# Altium footprint library Connectors.PcbLib: 122 footprints (part 6 of 8)
Each footprint in its own frame and in the unit in brackets; x right, y up, seen from the top. Pads: shape width x height; smd on the part's side, far side on the other; paste and mask are expansions set on the pad; w line width, h text height; cw(c..) or ccw(c..) is an arc to the next point about the centre after c.
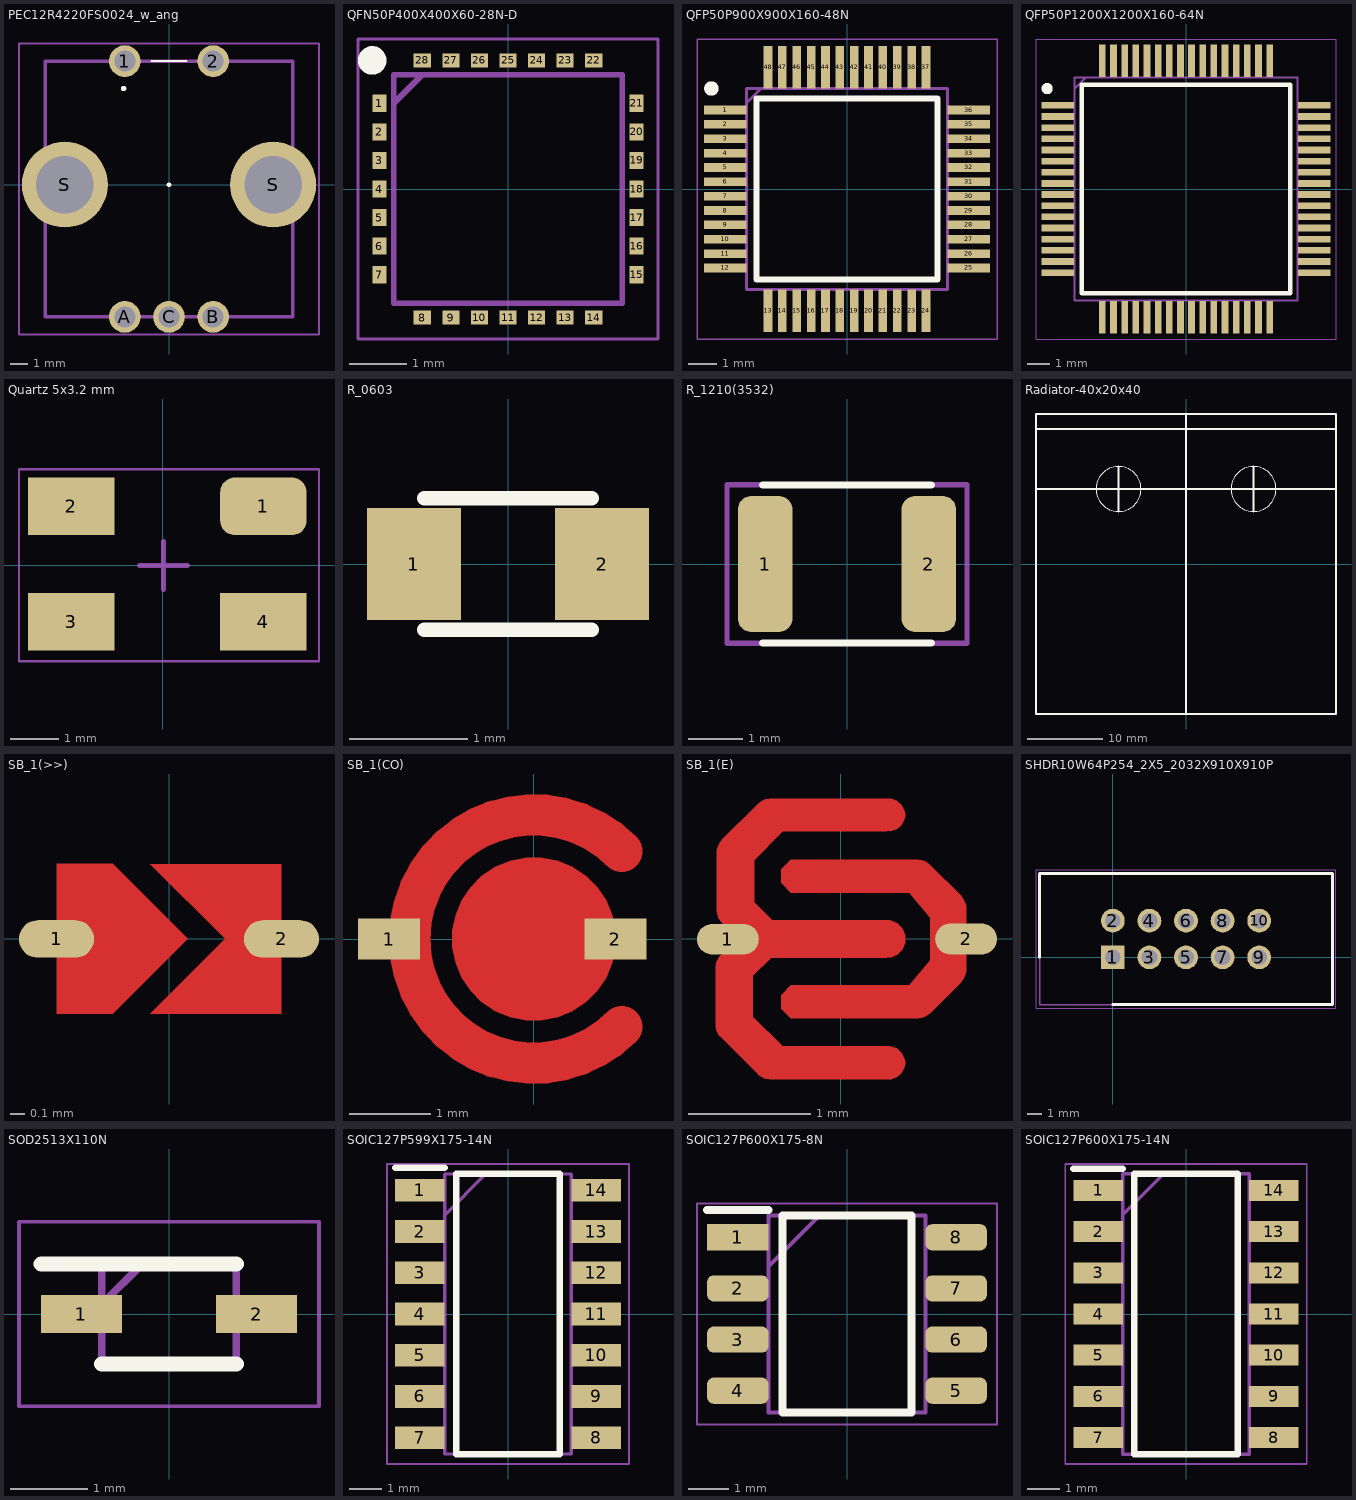
[diagram p5: the footprints below, top view; thin cyan lines are the x and y axes]

## PEC12R4220FS0024_w_ang [mm]
pads (7):
  round 1.8 hole 1.2: 1(-2.5,7) 2(2.5,7) A(-2.5,-7.5) B(2.5,-7.5) C(0,-7.5)
  round 4.875 hole 3.25: S(-5.9,0) S(5.9,0)
Top Overlay:
  lines w0.1: -1,7 1,7
  lines w0.2: -2.618,5.443 ccw(c-2.568,5.443) -2.518,5.443 ccw(c-2.568,5.443) -2.618,5.443
  lines w0.254: -0.01,0 0.01,0
Mechanical 13:
  lines w0.2: -7,-7.5 7,-7.5 7,7 -7,7 -7,-7.5
Mechanical 15:
  lines w0.1: -8.5,-8.5 8.5,-8.5 8.5,8 -8.5,8 -8.5,-8.5
3D body "PEC11R-4115F-S0018_w_ang.STEP": height 24.67, standoff -3.7, extent -10.054,-10.054 10.054,10.054

## QFN50P400X400X60-28N-D [mm]
pads (28):
  rect 0.25x0.3 smd: 1(-2.25,1.5) 2(-2.25,1) 3(-2.25,0.5) 4(-2.25,0) 5(-2.25,-0.5) 6(-2.25,-1) 7(-2.25,-1.5) 15(2.25,-1.5) 16(2.25,-1) 17(2.25,-0.5) 18(2.25,0) 19(2.25,0.5) 20(2.25,1) 21(2.25,1.5)
  rect 0.3x0.25 smd: 8(-1.5,-2.25) 9(-1,-2.25) 10(-0.5,-2.25) 11(0,-2.25) 12(0.5,-2.25) 13(1,-2.25) 14(1.5,-2.25) 22(1.5,2.25) 23(1,2.25) 24(0.5,2.25) 25(0,2.25) 26(-0.5,2.25) 27(-1,2.25) 28(-1.5,2.25)
Top Overlay:
  circle w0.25: c-2.375,2.25 r0.125
Mechanical 13:
  lines w0.1: -2,1.5 -1.5,2 ; -2,-2 2,-2 2,2 -2,2 -2,-2
Mechanical 15:
  lines w0.05: -2.625,-2.625 2.625,-2.625 2.625,2.625 -2.625,2.625 -2.625,-2.625
3D body "STM32L031G4U6.stp": height 0.6, standoff 0, extent -2.05,-2.05 2.05,2.05

## QFP50P900X900X160-48N [mm]
pads (48):
  rect 1.475x0.3 smd: 1(-4.238,2.75) 2(-4.238,2.25) 3(-4.238,1.75) 4(-4.238,1.25) 5(-4.238,0.75) 6(-4.238,0.25) 7(-4.238,-0.25) 8(-4.238,-0.75) 9(-4.238,-1.25) 10(-4.238,-1.75) 11(-4.238,-2.25) 12(-4.238,-2.75) 25(4.238,-2.75) 26(4.238,-2.25) 27(4.238,-1.75) 28(4.238,-1.25) 29(4.238,-0.75) 30(4.238,-0.25) 31(4.238,0.25) 32(4.238,0.75) 33(4.238,1.25) 34(4.238,1.75) 35(4.238,2.25) 36(4.238,2.75)
  rect 0.3x1.475 smd: 13(-2.75,-4.238) 14(-2.25,-4.238) 15(-1.75,-4.238) 16(-1.25,-4.238) 17(-0.75,-4.238) 18(-0.25,-4.238) 19(0.25,-4.238) 20(0.75,-4.238) 21(1.25,-4.238) 22(1.75,-4.238) 23(2.25,-4.238) 24(2.75,-4.238) 37(2.75,4.238) 38(2.25,4.238) 39(1.75,4.238) 40(1.25,4.238) 41(0.75,4.238) 42(0.25,4.238) 43(-0.25,4.238) 44(-0.75,4.238) 45(-1.25,4.238) 46(-1.75,4.238) 47(-2.25,4.238) 48(-2.75,4.238)
Top Overlay:
  circle w0.25: c-4.725,3.5 r0.125
  lines w0.2: -3.15,-3.15 -3.15,3.15 3.15,3.15 3.15,-3.15 -3.15,-3.15
Mechanical 13:
  lines w0.1: -3.5,3 -3,3.5 ; -3.5,-3.5 -3.5,3.5 3.5,3.5 3.5,-3.5 -3.5,-3.5
Mechanical 15:
  lines w0.05: -5.225,-5.225 -5.225,5.225 5.225,5.225 5.225,-5.225 -5.225,-5.225
3D body "STM32F103C8T6TR.stp": height 1.6, standoff 0, extent -4.5,-4.5 4.5,4.5

## QFP50P1200X1200X160-64N [mm]
pads (64):
  rect 1.45x0.3 smd: 1(-5.75,3.75) 2(-5.75,3.25) 3(-5.75,2.75) 4(-5.75,2.25) 5(-5.75,1.75) 6(-5.75,1.25) 7(-5.75,0.75) 8(-5.75,0.25) 9(-5.75,-0.25) 10(-5.75,-0.75) 11(-5.75,-1.25) 12(-5.75,-1.75) 13(-5.75,-2.25) 14(-5.75,-2.75) 15(-5.75,-3.25) 16(-5.75,-3.75) 33(5.75,-3.75) 34(5.75,-3.25) 35(5.75,-2.75) 36(5.75,-2.25) 37(5.75,-1.75) 38(5.75,-1.25) 39(5.75,-0.75) 40(5.75,-0.25) 41(5.75,0.25) 42(5.75,0.75) 43(5.75,1.25) 44(5.75,1.75) 45(5.75,2.25) 46(5.75,2.75) 47(5.75,3.25) 48(5.75,3.75)
  rect 0.3x1.45 smd: 17(-3.75,-5.75) 18(-3.25,-5.75) 19(-2.75,-5.75) 20(-2.25,-5.75) 21(-1.75,-5.75) 22(-1.25,-5.75) 23(-0.75,-5.75) 24(-0.25,-5.75) 25(0.25,-5.75) 26(0.75,-5.75) 27(1.25,-5.75) 28(1.75,-5.75) 29(2.25,-5.75) 30(2.75,-5.75) 31(3.25,-5.75) 32(3.75,-5.75) 49(3.75,5.75) 50(3.25,5.75) 51(2.75,5.75) 52(2.25,5.75) 53(1.75,5.75) 54(1.25,5.75) 55(0.75,5.75) 56(0.25,5.75) 57(-0.25,5.75) 58(-0.75,5.75) 59(-1.25,5.75) 60(-1.75,5.75) 61(-2.25,5.75) 62(-2.75,5.75) 63(-3.25,5.75) 64(-3.75,5.75)
Top Overlay:
  circle w0.25: c-6.225,4.5 r0.125
  lines w0.2: -4.675,-4.675 4.675,-4.675 4.675,4.675 -4.675,4.675 -4.675,-4.675
Mechanical 13:
  lines w0.1: -5,4.5 -4.5,5 ; -5,-5 5,-5 5,5 -5,5 -5,-5
Mechanical 15:
  lines w0.05: -6.725,-6.725 6.725,-6.725 6.725,6.725 -6.725,6.725 -6.725,-6.725
3D body "STM32F105R8T6.stp": height 1.6, standoff 0, extent -6,-6 6,6

## Quartz 5x3.2 mm [mm]
pads (4):
  rrect50% 1.8x1.2 smd: 1(2.092,1.229)
  rect 1.8x1.2 smd: 2(-1.908,1.229) 3(-1.908,-1.171) 4(2.092,-1.171)
Mechanical 8:
  lines w0.1: -0.492,0 0.008,0 ; 0.008,-0.5 0.008,0 ; 0.008,0.5 0.008,0 ; 0.508,0 0.008,0
Mechanical 15:
  lines w0.05: -3,-2 3.25,-2 3.25,2 -3,2 -3,-2
3D body "ABM3B.STEP": height 1.1, standoff -0.01, extent -2.5,-1.587 2.5,1.588

## R_0603 [mm] "Chip Resistor, EIA 0201, Metric 0603, Body 0.6 x 0.3mm, IPC Medium Density"
height 0.28
pads (2):
  rect 0.8x0.95 smd: 1(-0.8,0) 2(0.8,0)
Top Overlay:
  lines w0.127: -0.711,-0.559 0.711,-0.559 ; -0.711,0.559 0.711,0.559
3D body "RESC1608X64N.stp": height 0.64, standoff 0, extent -0.875,-0.475 0.875,0.475

## R_1210(3532) [mm]
pads (2):
  rrect50% 1x2.5 smd: 1(-1.5,0) 2(1.5,0)
Top Overlay:
  lines w0.127: -1.549,-1.45 1.549,-1.45 ; -1.549,1.45 1.549,1.45
Top Courtyard:
  lines w0.1: -2.2,-1.45 -2.2,1.45 2.2,1.45 2.2,-1.45 -2.2,-1.45
3D body "SMD R-1210.STEP": height 0.9, standoff 0.3, extent -1.6,-1.25 1.6,1.25

## Radiator-40x20x40 [mm]
Top Overlay:
  circle w0.01: c-9,10 r3
  circle w0.01: c9,10 r3
  lines w0.254: -20,10 20,10 ; -20,18 20,18 ; -9,7 -9,10 -9,13 ; 0,-20 0,0 0,20 0,18 0,15 ; 9,7 9,10 9,13 ; -20,-20 20,-20 20,20 -20,20 -20,-20
3D body: height 25, standoff 5, extent -20,-20 20,20

## SB_1(>>) [mil]
pads (2):
  oval 20x10 smd: 1(-30,0) 2(30,0)
Top Layer:
  region: -30,20 -30,-20 -15,-20 5,0 -15,20
  region: 30,20 30,0 30,-20 -5,-20 15,0 -5,20

## SB_1(CO) [mil]
pads (2):
  rect 30x20 smd: 1(-70,0) 2(39.37,0)
Top Layer:
  region: -39.37,0 -39.37,3.88 -37.86,11.48 -34.89,18.65 -30.58,25.1 -25.1,30.58 -18.65,34.89 -11.48,37.86 -3.88,39.37 0,39.37 3.88,39.37 11.48,37.86 18.65,34.89 25.1,30.58 30.58,25.1 34.89,18.65 37.86,11.48 39.37,3.88 39.37,0 39.37,-3.88 37.86,-11.48 34.89,-18.65 30.58,-25.1 25.1,-30.58 18.65,-34.89 11.48,-37.86 3.88,-39.37 0,-39.37 -3.88,-39.37 -11.48,-37.86 -18.65,-34.89 -25.1,-30.58 -30.58,-25.1 -34.89,-18.65 -37.86,-11.48 -39.37,-3.88
  lines w20: 42.43,-42.43 cw(c0,0) 42.43,42.43

## SB_1(E) [mil]
pads (2):
  oval 20x10 smd: 1(-36.52,-0.08) 2(40.46,0)
Top Layer:
  region: -38.68,-31.83 -39.11,-31.41 -39.77,-30.42 -40.23,-29.32 -40.46,-28.16 -40.46,-27.56 -40.46,-9.42 -40.46,-8.82 -40.23,-7.66 -39.77,-6.56 -39.11,-5.57 -38.68,-5.15 -37.74,-4.08 -36.57,-1.5 -36.48,1.33 -37.47,3.99 -38.34,5.11 -38.34,5.12 -38.76,5.53 -39.42,6.52 -39.87,7.61 -40.1,8.78 -40.1,9.37 -40.1,27.92 -40.1,28.52 -39.87,29.69 -39.41,30.79 -38.74,31.78 -38.32,32.2 -26.89,43.62 -26.47,44.04 -25.49,44.7 -24.39,45.16 -23.23,45.39 -22.64,45.38 -22.64,45.39 14.76,45.38 15.9,45.45 18.04,44.7 19.73,43.18 20.72,41.13 20.78,40 20.69,38.89 19.69,36.9 17.99,35.45 15.88,34.76 14.76,34.85 -18.79,34.85 -28.07,25.43 -28.07,11.86 -22.22,6.01 14.76,6.01 15.96,6.02 18.17,5.1 19.86,3.41 20.78,1.2 20.78,0 20.78,-1.2 19.86,-3.41 18.17,-5.1 15.96,-6.02 14.76,-6.01 -22.54,-6.01 -28.43,-11.91 -28.43,-25.07 -18.79,-34.75 14.76,-34.75 15.88,-34.67 18.01,-35.39 19.71,-36.87 20.7,-38.88 20.78,-40 20.72,-41.13 19.73,-43.18 18.04,-44.7 15.9,-45.45 14.76,-45.39 -22.64,-45.39 -23.23,-45.39 -24.4,-45.15 -25.5,-44.69 -26.49,-44.03 -26.91,-43.6
  region: -14,-15 22.11,-15 28.88,-6.81 28.88,6.81 22.11,15 -14,15 -16.22,15 -19.35,18.13 -19.35,22.57 -16.22,25.7 -14,25.7 24.61,25.7 25.2,25.7 26.37,25.47 27.47,25.01 28.46,24.34 28.88,23.92 38.7,14.1 39.12,13.68 39.78,12.69 40.24,11.6 40.47,10.44 40.46,9.84 40.46,-9.84 40.46,-10.44 40.23,-11.61 39.77,-12.71 39.11,-13.7 38.68,-14.12 28.86,-23.94 28.44,-24.36 27.46,-25.02 26.36,-25.47 25.2,-25.7 24.61,-25.7 -14,-25.7 -16.22,-25.7 -19.35,-22.57 -19.35,-18.13 -16.22,-15

## SHDR10W64P254_2X5_2032X910X910P [mm]
pads (10):
  rect 1.65x1.65 hole 1.1: 1(0,0)
  round 1.65 hole 1.1: 2(0,2.54) 3(2.54,0) 4(2.54,2.54) 5(5.08,0) 6(5.08,2.54) 7(7.62,0) 8(7.62,2.54) 9(10.16,0) 10(10.16,2.54)
Top Overlay:
  lines w0.2: -5.08,0 -5.08,5.82 15.24,5.82 15.24,-3.28 0,-3.28
Mechanical 13:
  lines w0.1: -5.08,-3.28 -5.08,5.82 15.24,5.82 15.24,-3.28 -5.08,-3.28
Mechanical 15:
  lines w0.05: -5.33,-3.53 -5.33,6.07 15.49,6.07 15.49,-3.53 -5.33,-3.53
3D body "BH-10SG.stp": height 9.1, standoff -3.35, extent -5.08,-3.28 15.24,5.82

## SOD2513X110N [mm]
pads (2):
  rect 1.05x0.5 smd: 1(-1.138,0) 2(1.138,0)
Top Overlay:
  lines w0.2: -1.662,0.65 0.875,0.65 ; -0.875,-0.65 0.875,-0.65
Mechanical 13:
  lines w0.1: -0.875,0.125 -0.35,0.65 ; -0.875,-0.65 -0.875,0.65 0.875,0.65 0.875,-0.65 -0.875,-0.65
Mechanical 15:
  lines w0.05: -1.95,-1.2 -1.95,1.2 1.95,1.2 1.95,-1.2 -1.95,-1.2
3D body "BAT165E6327HTSA1.stp": height 1.1, standoff 0, extent -1.25,-0.65 1.25,0.65

## SOIC127P599X175-14N [mm]
pads (14):
  rect 1.526x0.7 smd: 1(-2.712,3.81) 2(-2.712,2.54) 3(-2.712,1.27) 4(-2.712,0) 5(-2.712,-1.27) 6(-2.712,-2.54) 7(-2.712,-3.81) 8(2.712,-3.81) 9(2.712,-2.54) 10(2.712,-1.27) 11(2.712,0) 12(2.712,1.27) 13(2.712,2.54) 14(2.712,3.81)
Top Overlay:
  lines w0.2: -3.475,4.51 -1.95,4.51 ; -1.6,-4.312 -1.6,4.312 1.6,4.312 1.6,-4.312 -1.6,-4.312
Mechanical 13:
  lines w0.1: -1.95,3.042 -0.68,4.312 ; -1.95,-4.312 -1.95,4.312 1.95,4.312 1.95,-4.312 -1.95,-4.312
Mechanical 15:
  lines w0.05: -3.725,-4.619 -3.725,4.619 3.725,4.619 3.725,-4.619 -3.725,-4.619
3D body "DS90LV019TM_NOPB.stp": height 1.75, standoff 0, extent -2.997,-4.312 2.997,4.312

## SOIC127P600X175-8N [mm]
pads (8):
  rect 1.525x0.65 smd: 1(-2.712,1.905)
  rrect50% 1.525x0.65 smd: 2(-2.712,0.635) 3(-2.712,-0.635) 4(-2.712,-1.905) 5(2.712,-1.905) 6(2.712,-0.635) 7(2.712,0.635) 8(2.712,1.905)
Top Overlay:
  lines w0.2: -3.475,2.58 -1.95,2.58 ; -1.6,-2.45 1.6,-2.45 1.6,2.45 -1.6,2.45 -1.6,-2.45
Mechanical 13:
  lines w0.1: -1.95,1.18 -0.68,2.45 ; -1.95,-2.45 1.95,-2.45 1.95,2.45 -1.95,2.45 -1.95,-2.45
Mechanical 15:
  lines w0.05: -3.725,-2.75 3.725,-2.75 3.725,2.75 -3.725,2.75 -3.725,-2.75
3D body "NE555DR.stp": height 1.75, standoff 0, extent -3,-2.45 3,2.45

## SOIC127P600X175-14N [mm]
pads (14):
  rect 1.525x0.65 smd: 1(-2.712,3.81) 2(-2.712,2.54) 3(-2.712,1.27) 4(-2.712,0) 5(-2.712,-1.27) 6(-2.712,-2.54) 7(-2.712,-3.81) 8(2.712,-3.81) 9(2.712,-2.54) 10(2.712,-1.27) 11(2.712,0) 12(2.712,1.27) 13(2.712,2.54) 14(2.712,3.81)
Top Overlay:
  lines w0.2: -3.475,4.485 -1.95,4.485 ; -1.6,-4.325 1.6,-4.325 1.6,4.325 -1.6,4.325 -1.6,-4.325
Mechanical 13:
  lines w0.1: -1.95,3.055 -0.68,4.325 ; -1.95,-4.325 1.95,-4.325 1.95,4.325 -1.95,4.325 -1.95,-4.325
Mechanical 15:
  lines w0.05: -3.725,-4.625 3.725,-4.625 3.725,4.625 -3.725,4.625 -3.725,-4.625
3D body "CD74ACT08M.stp": height 1.75, standoff 0, extent -3,-4.325 3,4.325